# Altium footprint library FootprintHole.PcbLib: 100 footprints (part 5 of 7)
Each footprint in its own frame and in the unit in brackets; x right, y up, seen from the top. Pads: shape width x height; smd on the part's side, far side on the other; paste and mask are expansions set on the pad; w line width, h text height; cw(c..) or ccw(c..) is an arc to the next point about the centre after c.
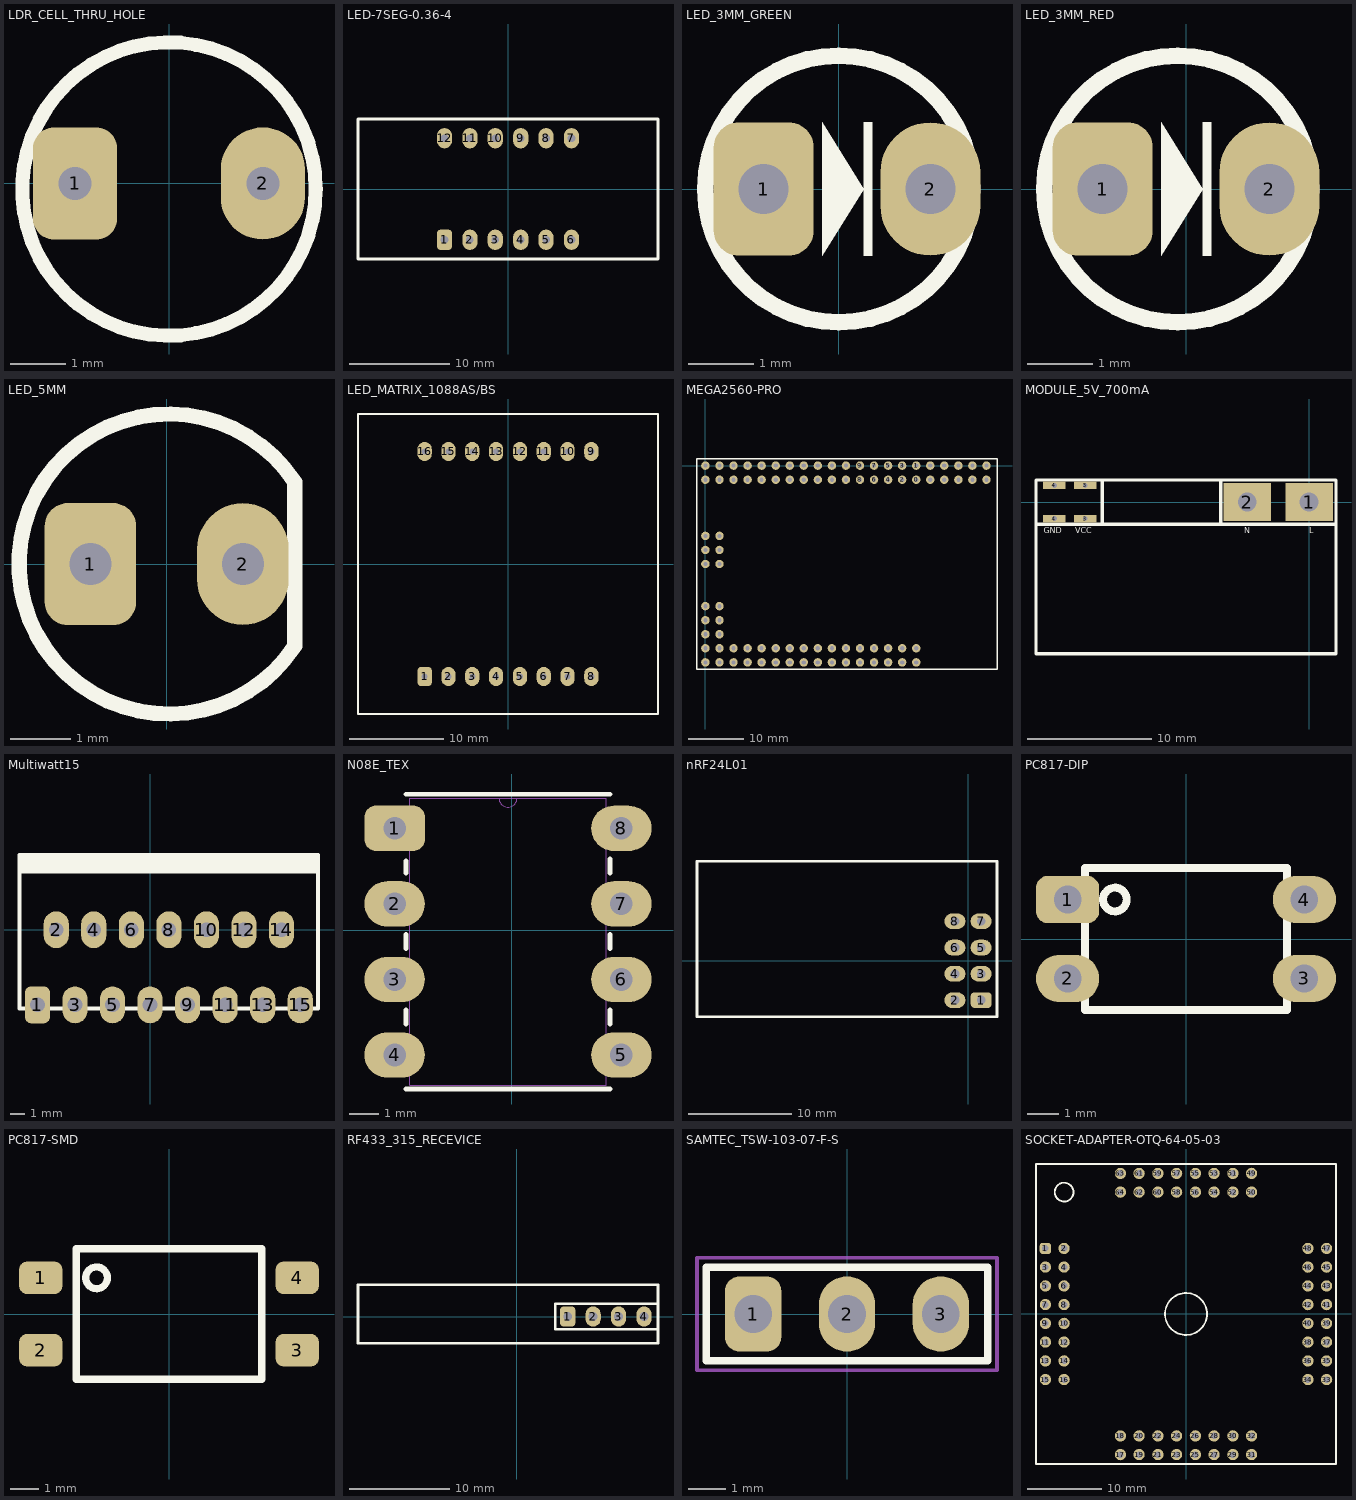
[diagram p4: the footprints below, top view; thin cyan lines are the x and y axes]

## LDR_CELL_THRU_HOLE [mil]
pads (2):
  rrect50% 60x80 hole 23.62: 1(-66.93,0)
  oval 60x80 hole 23.62: 2(66.93,0)
Top Overlay:
  circle w10: c0,-3.94 r104.61
3D body "LDR_pcb_TH.SLDPRT": height 79.53, standoff -118.11, extent -100.39,-84.64 100.4,84.65

## LED-7SEG-0.36-4 [mil]
pads (12):
  rrect50% 60x80 hole 30: 1(-250,-200)
  oval 60x80 hole 30: 2(-150,-200) 3(-50,-200) 4(50,-200) 5(150,-200) 6(250,-200) 7(250,200) 8(150,200) 9(50,200) 10(-50,200) 11(-150,200) 12(-250,200)
Top Overlay:
  lines w10: -590.55,-275.59 -590.55,275.59 590.55,275.59 590.55,-275.59 -590.55,-275.59

## LED_3MM_GREEN [mil]
pads (2):
  rrect50% 60x80 hole 30: 1(-45,0)
  oval 60x80 hole 30: 2(55,0)
Top Overlay:
  circle w10: c0,0 r80
  region: 15,40 20,40 20,-40 15,-40
  region: -10,40 -10,-40 15,0
3D body "everlight-3MM-LED-GREEN.STEP": height 222.54, standoff -272.25, extent -69.8,-74.8 65.08,74.81

## LED_3MM_RED [mil]
pads (2):
  rrect50% 60x80 hole 30: 1(-50,0)
  oval 60x80 hole 30: 2(50,0)
Top Overlay:
  circle w10: c-5,0 r80
  region: -15,40 -15,-40 10,0
  region: 10,40 15,40 15,-40 10,-40
3D body "everlight-3MM-LED-RED.STEP": height 222.54, standoff -272.25, extent -75,-74.8 59.88,74.81

## LED_5MM [mil]
pads (2):
  rrect50% 60x80 hole 27.56: 1(-50,0)
  oval 60x80 hole 27.56: 2(50,0)
Top Overlay:
  lines w10: 83.95,-53.7 cw(c1.53,0.03) 83.95,53.75 83.95,-53.69
3D body "5mm LED.STEP": height 338.58, standoff -1062.99, extent -116.14,-116.14 98.42,116.14

## LED_MATRIX_1088AS/BS [mil]
pads (16):
  rrect50% 60x80 hole 25: 1(-350,-472.44)
  oval 60x80 hole 25: 2(-250,-472.44) 3(-150,-472.44) 4(-50,-472.44) 5(50,-472.44) 6(150,-472.44) 7(250,-472.44) 8(350,-472.44) 9(350,472.44) 10(250,472.44) 11(150,472.44) 12(50,472.44) 13(-50,472.44) 14(-150,472.44) 15(-250,472.44) 16(-350,472.44)
Top Overlay:
  lines w10: -629.92,-629.92 629.92,-629.92 629.92,629.92 -629.92,629.92 -629.92,-629.92
3D body "User Library-User Library-Bicolor-LED-Matrix.STEP": height 315, standoff -236.22, extent -629.91,-629.91 629.93,629.93

## MEGA2560-PRO [mil]
pads (86):
  round 60 hole 30: 0(1500,-100) 1(1500,0) 2(1400,-100) 3(1400,0) 4(1300,-100) 5(1300,0) 6(1200,-100) 7(1200,0) 8(1100,-100) 9(1100,0) 10(1000,-100) 11(1000,0) 12(900,-100) 13(900,0) 14(800,-100) 15(800,0) 16(700,-100) 17(700,0) 18(600,-100) 19(600,0) 20(500,-100) 21(500,0) 22(400,-100) 23(400,0) 24(300,-100) 25(300,0) 26(200,-100) 27(200,0) 28(100,-100) 29(100,0) 30(0,-100) 31(0,0) 32(700,-1400) 33(700,-1300) 34(600,-1400) 35(600,-1300) 36(500,-1400) 37(500,-1300) 38(400,-1400) 39(400,-1300) 40(300,-1400) 41(300,-1300) 42(200,-1400) 43(200,-1300) 44(100,-1400) 45(100,-1300) 46(0,-1400) 47(0,-1300) 48(0,-1200) 49(100,-1200) 50(0,-1100) 51(100,-1100) 52(0,-1000) 53(100,-1000) 54(1500,-1400) 55(1500,-1300) 56(1400,-1400) 57(1400,-1300) 58(1300,-1400) 59(1300,-1300) 60(1200,-1400) 61(1200,-1300) 62(1100,-1400) 63(1100,-1300) 64(1000,-1400) 65(1000,-1300) 66(900,-1400) 67(900,-1300) 68(800,-1400) 69(800,-1300) 70(2000,-100) 71(2000,0) 72(1900,-100) 73(1900,0) 74(1800,-100) 75(1800,0) 76(1700,-100) 77(1700,0) 78(1600,-100) 79(1600,0) 80(100,-500) 81(0,-500) 82(100,-600) 83(0,-600) 84(100,-700) 85(0,-700)
Top Overlay:
  lines w10: -60,-1450 2075,-1450 2075,50 -60,50 -60,-1450
3D body "MEGA 2560 PRO (EMBED).stp": height 234, standoff -1, extent -54.99,-1448.04 2074.3,48.03

## MODULE_5V_700mA [mil]
pads (6):
  rect 150x120 hole 60 square: 1(0,0) 2(-196,0)
  rect 70.87x23.62 hole 15.75: 3(-709,-52) 3(-709,53) 4(-807,-52) 4(-807,53)
Top Overlay:
  lines w10: -865,-15 -865,-480 85,-480 85,60 ; -655,-70 -655,70 ; -280,-70 -280,70 85,70 85,-70 -865,-70 -865,70 -260,70
  text "VCC" at -739.97,-104.65 h31.5
  text "GND" at -840,-104.65 h31.5
  text "L" at 0,-105 h31.5
  text "N" at -205,-105 h31.5

## Multiwatt15 [mm]
pads (15):
  rrect50% 1.7x2.5 hole 1: 1(-7.62,-5.08)
  oval 1.7x2.5 hole 1: 2(-6.35,0) 3(-5.08,-5.08) 4(-3.81,0) 5(-2.54,-5.08) 6(-1.27,0) 7(0,-5.08) 8(1.27,0) 9(2.54,-5.08) 10(3.81,0) 11(5.08,-5.08) 12(6.35,0) 13(7.62,-5.08) 14(8.89,0) 15(10.16,-5.08)
Top Overlay:
  rectangle: -8.83,3.81 11.43,5.08
  lines w0.254: 11.37,5.08 11.37,5.08 ; 11.37,5.08 11.37,-5.33 -8.83,-5.33 -8.83,5.08 11.37,5.08
3D body "STMicroelectronics_Multiwatt15_V.STEP": height 22.15, standoff -2.85, extent -8.83,-5.33 11.37,5.08

## N08E_TEX [mil]
pads (8):
  rrect50% 80x60 / inner rect 60x60 / far side rect 60x60 hole 30 mask+0: 1(-155,135)
  oval 80x60 / inner round 60 / far side round 60 hole 30 mask+0: 2(-155,35) 3(-155,-65) 4(-155,-165) 5(145,-165) 6(145,-65) 7(145,35) 8(145,135)
Top Overlay:
  lines w6: -140,-210 130,-210 ; -140,-124.59 -140,-105.41 ; -140,-24.59 -140,-5.41 ; -140,75.41 -140,91.9 ; -140,180 130,180 ; 130,-124.59 130,-105.41 ; 130,-24.59 130,-5.41 ; 130,75.41 130,94.59
Mechanical 13:
  lines w0: -17,175 ccw(c-5,175) 7,175
  lines w1: -171,-181 -135,-181 -135,-149 -171,-149 -171,-181 ; -171,-81 -135,-81 -135,-49 -171,-49 -171,-81 ; -171,19 -135,19 -135,51 -171,51 -171,19 ; -171,119 -135,119 -135,151 -171,151 -171,119 ; -135,-205 -135,175 125,175 125,-205 -135,-205 ; 125,-181 161,-181 161,-149 125,-149 125,-181 ; 125,-81 161,-81 161,-49 125,-49 125,-81 ; 125,19 161,19 161,51 125,51 125,19 ; 125,119 161,119 161,151 125,151 125,119
  text "*" at -137.5,110 h50
3D body "N08E_TEX.step": height 215.12, standoff -100, extent -165,-205 155,175
3D body: height 10, standoff 0, extent -155,135 -145,145

## nRF24L01 [mil]
pads (8):
  rrect50% 80x60 hole 33.46: 1(50,-150)
  oval 80x60 hole 33.46: 2(-50,-150) 3(50,-50) 4(-50,-50) 5(50,50) 6(-50,50) 7(50,150) 8(-50,150)
Top Overlay:
  lines w10: -1031.5,-212.6 -1031.5,377.95 110.24,377.95 110.24,-212.6 -1031.5,-212.6
3D body "zl201-1_p2-54_l2-54_w2-54_h8-89.stp": height 395.59, standoff -74.41, extent -100,100 0,200
3D body "zl201-1_p2-54_l2-54_w2-54_h8-89.stp": height 395.59, standoff -74.41, extent 0,100 100,200
3D body "zl201-1_p2-54_l2-54_w2-54_h8-89.stp": height 395.59, standoff -74.41, extent -100,0.02 0,100.02
3D body "zl201-1_p2-54_l2-54_w2-54_h8-89.stp": height 395.59, standoff -74.41, extent 0,0.02 100,100.02
3D body "zl201-1_p2-54_l2-54_w2-54_h8-89.stp": height 395.59, standoff -74.41, extent -99.99,-99.98 0.01,0.02
3D body "zl201-1_p2-54_l2-54_w2-54_h8-89.stp": height 395.59, standoff -74.41, extent -100,-199.98 0,-99.98
3D body "zl201-1_p2-54_l2-54_w2-54_h8-89.stp": height 395.59, standoff -74.41, extent 0,-99.98 100,0.02
3D body "zl201-1_p2-54_l2-54_w2-54_h8-89.stp": height 395.59, standoff -74.41, extent 0,-199.98 100,-99.98
3D body "User Library-NRF24L01-A.STEP": height 433.86, standoff 255.91, extent -1031.49,-212.6 110.24,377.95

## PC817-DIP [mil]
pads (4):
  rrect50% 80x60 hole 35: 1(-150,50)
  oval 80x60 hole 35: 2(-150,-50) 3(150,-50) 4(150,50)
Top Overlay:
  circle w10: c-90,50 r15
  lines w10: -127.95,-90.16 127.95,-90.16 127.95,90.16 -127.95,90.16 -127.95,-90.16
3D body "pc817 dip6.step": height 169.29, standoff -106.3, extent -155.12,-90.36 155.12,90.37

## PC817-SMD [mil]
pads (4):
  rrect50% 60x45 smd: 1(-177.17,50) 2(-177.17,-50) 3(177.17,-50) 4(177.17,50)
Top Overlay:
  circle w10: c-100,50 r15
  lines w10: -127.95,-90.16 127.95,-90.16 127.95,90.16 -127.95,90.16 -127.95,-90.16
3D body "PC817_smd.STEP": height 150.9, standoff -0.73, extent -196.85,-90.16 196.86,90.16

## RF433_315_RECEVICE [mil]
pads (4):
  rrect50% 60x80 hole 35: 1(200,0)
  oval 60x80 hole 35: 2(300,0) 3(400,0) 4(500,0)
Top Overlay:
  lines w9.84: 550,-50 150,-50 150,50 555,50 ; -625,-105 555,-105 555,125 -625,125 -625,-105
3D body "User Library-pc-jc02RA.STEP": height 472.44, standoff -223.62, extent -625.98,-105.08 555.12,167.37

## SAMTEC_TSW-103-07-F-S [mil]
pads (3):
  rrect50% 60x80 hole 40: 1(-100,0)
  oval 60x80 hole 40: 2(0,0) 3(100,0)
Top Overlay:
  lines w7.87: -150,-50 -150,50 150,50 150,-50 -150,-50
Mechanical 15:
  lines w3.94: -119.69,0 -80.31,0 ; -100,-19.68 -100,19.68 ; -159.84,-59.84 -159.84,59.84 159.84,59.84 159.84,-59.84 -159.84,-59.84
3D body "SAMTEC_TSW-103-07-F-S.STEP": height 329.92, standoff -100, extent -149.99,-50 150.01,50

## SOCKET-ADAPTER-OTQ-64-05-03 [mil]
pads (64):
  rrect50% 60x60 hole 35: 1(-750,350)
  round 60 hole 35: 2(-650,350) 3(-750,250) 4(-650,250) 5(-750,150) 6(-650,150) 7(-750,50) 8(-650,50) 9(-750,-50) 10(-650,-50) 11(-750,-150) 12(-650,-150) 13(-750,-250) 14(-650,-250) 15(-750,-350) 16(-650,-350) 17(-350,-750) 18(-350,-650) 19(-250,-750) 20(-250,-650) 21(-150,-750) 22(-150,-650) 23(-50,-750) 24(-50,-650) 25(50,-750) 26(50,-650) 27(150,-750) 28(150,-650) 29(250,-750) 30(250,-650) 31(350,-750) 32(350,-650) 33(750,-350) 34(650,-350) 35(750,-250) 36(650,-250) 37(750,-150) 38(650,-150) 39(750,-50) 40(650,-50) 41(750,50) 42(650,50) 43(750,150) 44(650,150) 45(750,250) 46(650,250) 47(750,350) 48(650,350) 49(350,750) 50(350,650) 51(250,750) 52(250,650) 53(150,750) 54(150,650) 55(50,750) 56(50,650) 57(-50,750) 58(-50,650) 59(-150,750) 60(-150,650) 61(-250,750) 62(-250,650) 63(-350,750) 64(-350,650)
Top Overlay:
  circle w10: c-650,650 r50
  circle w10: c0,0 r111.8
  lines w10: -800,-800 -800,800 800,800 800,-800 -800,-800
3D body "Pin Header 1x2 TH Pitch 2.54mm.stp": height 373.85, standoff -125.98, extent -799.99,-399.99 -599.99,-299.99
3D body "Pin Header 1x2 TH Pitch 2.54mm.stp": height 373.85, standoff -125.98, extent -799.99,-199.99 -599.99,-99.99
3D body "Pin Header 1x2 TH Pitch 2.54mm.stp": height 373.85, standoff -125.98, extent -799.99,-299.99 -599.99,-199.99
3D body "Pin Header 1x2 TH Pitch 2.54mm.stp": height 373.85, standoff -125.98, extent -799.99,100.01 -599.99,200.01
3D body "Pin Header 1x2 TH Pitch 2.54mm.stp": height 373.85, standoff -125.98, extent -799.99,200.01 -599.99,300.01
3D body "Pin Header 1x2 TH Pitch 2.54mm.stp": height 373.85, standoff -125.98, extent -800,300 -600,400
3D body "Pin Header 1x2 TH Pitch 2.54mm.stp": height 373.85, standoff -125.98, extent -799.99,0.01 -599.99,100.01
3D body "Pin Header 1x2 TH Pitch 2.54mm.stp": height 373.85, standoff -125.98, extent -799.99,-99.99 -599.99,0.01
3D body "Pin Header 1x2 TH Pitch 2.54mm.stp": height 373.85, standoff -125.98, extent 299.99,-799.99 399.99,-599.99
3D body "Pin Header 1x2 TH Pitch 2.54mm.stp": height 373.85, standoff -125.98, extent 99.99,-799.99 199.99,-599.99
3D body "Pin Header 1x2 TH Pitch 2.54mm.stp": height 373.85, standoff -125.98, extent 199.99,-799.99 299.99,-599.99
3D body "Pin Header 1x2 TH Pitch 2.54mm.stp": height 373.85, standoff -125.98, extent -200.01,-799.99 -100.01,-599.99
3D body "Pin Header 1x2 TH Pitch 2.54mm.stp": height 373.85, standoff -125.98, extent -300.01,-799.99 -200.01,-599.99
3D body "Pin Header 1x2 TH Pitch 2.54mm.stp": height 373.85, standoff -125.98, extent -400,-800 -300,-600
3D body "Pin Header 1x2 TH Pitch 2.54mm.stp": height 373.85, standoff -125.98, extent -100.01,-799.99 -0.01,-599.99
3D body "Pin Header 1x2 TH Pitch 2.54mm.stp": height 373.85, standoff -125.98, extent -0.01,-799.99 99.99,-599.99
3D body "Pin Header 1x2 TH Pitch 2.54mm.stp": height 373.85, standoff -125.98, extent 599.99,299.99 799.99,399.99
3D body "Pin Header 1x2 TH Pitch 2.54mm.stp": height 373.85, standoff -125.98, extent 599.99,99.99 799.99,199.99
3D body "Pin Header 1x2 TH Pitch 2.54mm.stp": height 373.85, standoff -125.98, extent 599.99,199.99 799.99,299.99
3D body "Pin Header 1x2 TH Pitch 2.54mm.stp": height 373.85, standoff -125.98, extent 599.99,-200.01 799.99,-100.01
3D body "Pin Header 1x2 TH Pitch 2.54mm.stp": height 373.85, standoff -125.98, extent 599.99,-300.01 799.99,-200.01
3D body "Pin Header 1x2 TH Pitch 2.54mm.stp": height 373.85, standoff -125.98, extent 600,-400 800,-300
3D body "Pin Header 1x2 TH Pitch 2.54mm.stp": height 373.85, standoff -125.98, extent 599.99,-100.01 799.99,-0.01
3D body "Pin Header 1x2 TH Pitch 2.54mm.stp": height 373.85, standoff -125.98, extent 599.99,-0.01 799.99,99.99
3D body "Pin Header 1x2 TH Pitch 2.54mm.stp": height 373.85, standoff -125.98, extent -399.99,599.99 -299.99,799.99
3D body "Pin Header 1x2 TH Pitch 2.54mm.stp": height 373.85, standoff -125.98, extent -199.99,599.99 -99.99,799.99
3D body "Pin Header 1x2 TH Pitch 2.54mm.stp": height 373.85, standoff -125.98, extent -299.99,599.99 -199.99,799.99
3D body "Pin Header 1x2 TH Pitch 2.54mm.stp": height 373.85, standoff -125.98, extent 100.01,599.99 200.01,799.99
3D body "Pin Header 1x2 TH Pitch 2.54mm.stp": height 373.85, standoff -125.98, extent 200.01,599.99 300.01,799.99
3D body "Pin Header 1x2 TH Pitch 2.54mm.stp": height 373.85, standoff -125.98, extent 300,600 400,800
3D body "Pin Header 1x2 TH Pitch 2.54mm.stp": height 373.85, standoff -125.98, extent 0.01,599.99 100.01,799.99
3D body "Pin Header 1x2 TH Pitch 2.54mm.stp": height 373.85, standoff -125.98, extent -99.99,599.99 0.01,799.99